# Altium footprint library DrPCB.PcbLib: 910 footprints (part 55 of 57)
Each footprint in its own frame and in the unit in brackets; x right, y up, seen from the top. Pads: shape width x height; smd on the part's side, far side on the other; paste and mask are expansions set on the pad; w line width, h text height; cw(c..) or ccw(c..) is an arc to the next point about the centre after c.
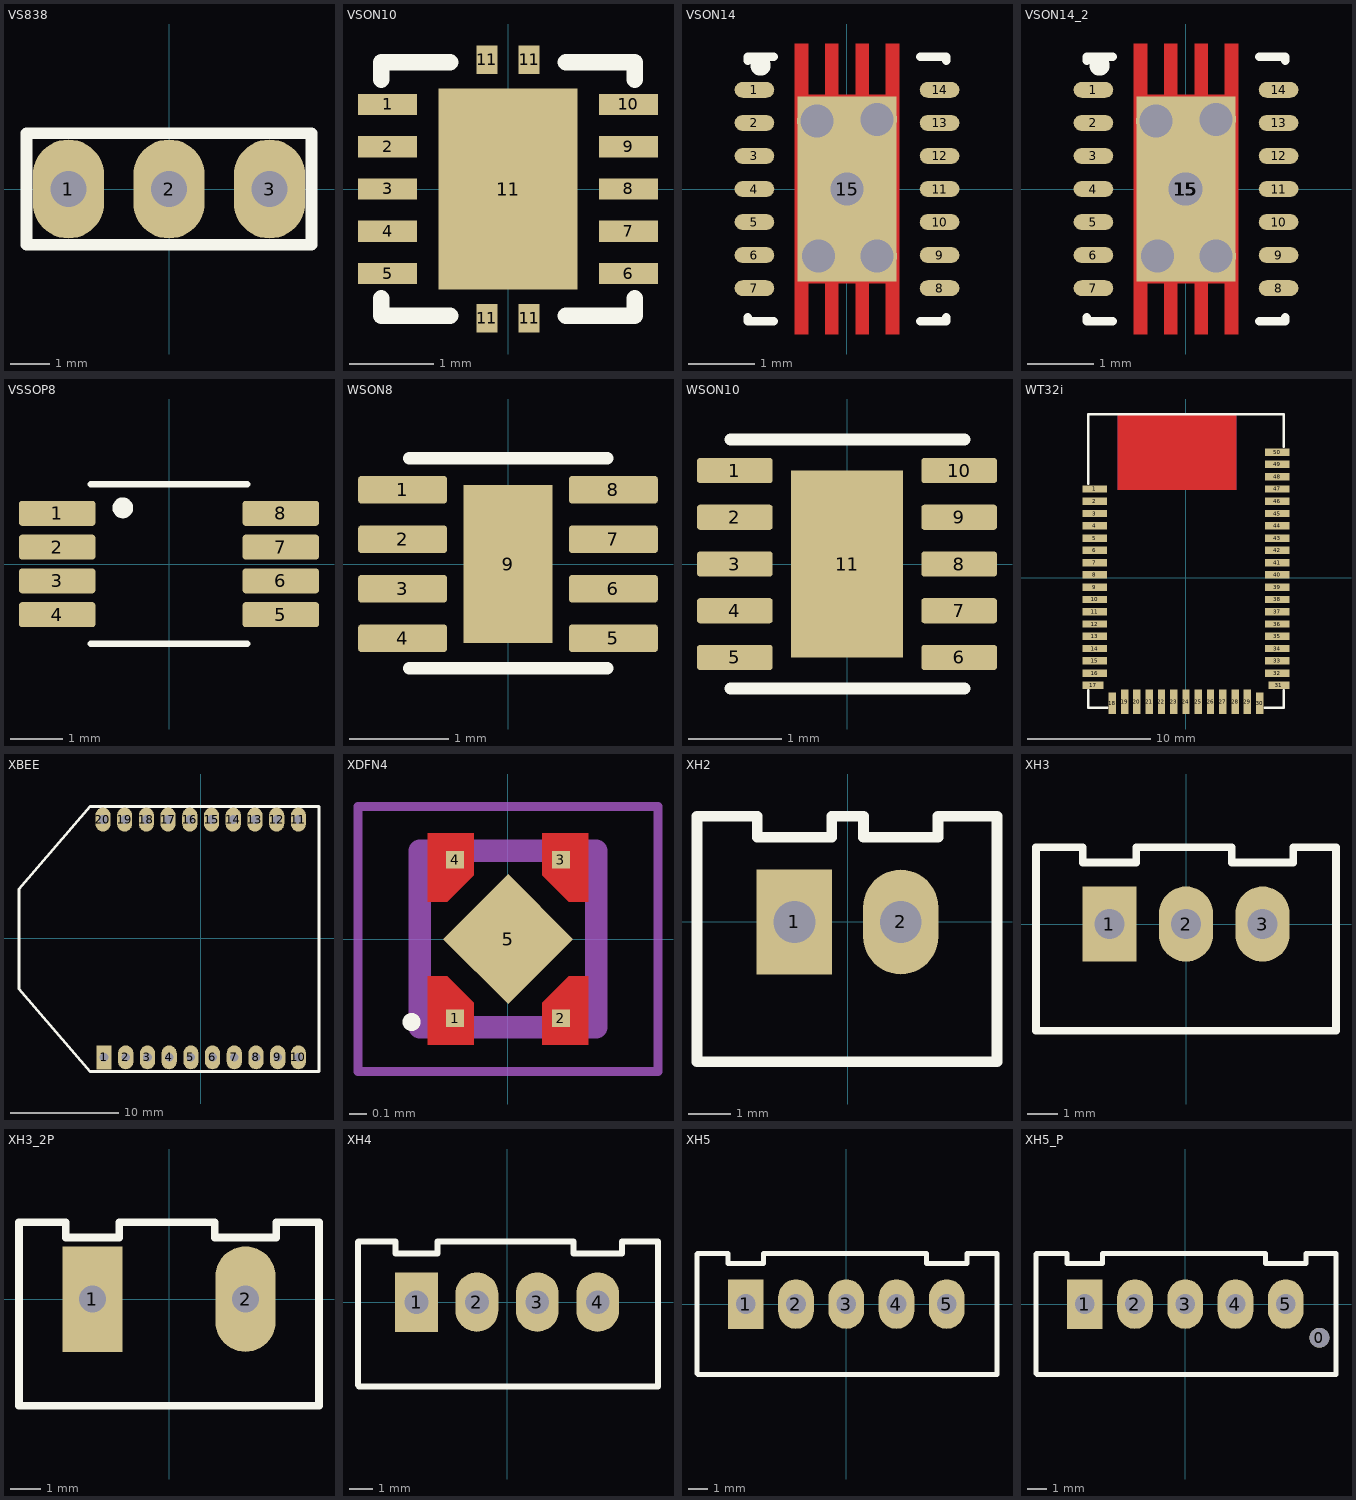
[diagram p54: the footprints below, top view; thin cyan lines are the x and y axes]

## VS838 [mm]
pads (3):
  oval 1.8x2.5 hole 0.9: 1(-2.54,0) 2(0,0) 3(2.54,0)
Top Overlay:
  lines w0.3: -3.6,-1.41 3.6,-1.41 3.6,1.41 -3.6,1.41 -3.6,-1.41
3D body "everlight-irm-3638f4.step": height 8.11, standoff -0.75, extent -3,-0.26 3,9.19

## VSON10 [mm]
pads (15):
  rect 0.7x0.25 smd: 1(-1.425,1) 2(-1.425,0.5) 3(-1.425,0) 4(-1.425,-0.5) 5(-1.425,-1) 6(1.425,-1) 7(1.425,-0.5) 8(1.425,0) 9(1.425,0.5) 10(1.425,1)
  rect 0.25x0.34 smd: 11(-0.25,-1.53) 11(-0.25,1.53) 11(0.25,-1.53) 11(0.25,1.53)
  rect 1.65x2.38 smd: 11(0,0)
Top Overlay:
  lines w0.2: -1.5,-1.295 -1.5,-1.5 -0.686,-1.5 ; -1.5,1.295 -1.5,1.5 -0.686,1.5 ; 0.686,-1.5 1.5,-1.5 1.5,-1.295 ; 0.686,1.5 1.5,1.5 1.5,1.295
3D body "User Library-PVSON-10-1.STEP": height 0.91, standoff 0.01, extent -1.501,-1.501 1.501,1.501

## VSON14 [mm]
pads (15):
  oval 0.6x0.24 smd mask+0: 1(-1.4,1.5) 2(-1.4,1) 3(-1.4,0.5) 4(-1.4,0) 5(-1.4,-0.5) 6(-1.4,-1) 7(-1.4,-1.5) 8(1.4,-1.5) 9(1.4,-1) 10(1.4,-0.5) 11(1.4,0) 12(1.4,0.5) 13(1.4,1) 14(1.4,1.5)
  rect 1.5x2.8 smd paste-2 mask+0: 15(0,0)
via 0,0 diameter 0.6 hole 0.5
via 0.457,1.054 diameter 0.6 hole 0.5
via -0.457,1.029 diameter 0.6 hole 0.5
via 0.457,-1.016 diameter 0.6 hole 0.5
via -0.432,-1.016 diameter 0.6 hole 0.5
Top Layer:
  region: 0.79,-2.2 0.59,-2.2 0.59,-1.425 0.33,-1.425 0.33,-2.2 0.13,-2.2 0.13,-1.425 -0.13,-1.425 -0.13,-2.2 -0.33,-2.2 -0.33,-1.425 -0.59,-1.425 -0.59,-2.2 -0.79,-2.2 -0.79,2.2 -0.59,2.2 -0.59,1.425 -0.33,1.425 -0.33,2.2 -0.13,2.2 -0.13,1.425 0.13,1.425 0.13,2.2 0.33,2.2 0.33,1.425 0.59,1.425 0.59,2.2 0.79,2.2
Top Overlay:
  circle w0.254: c-1.308,1.867 r0.025
  lines w0.127: -1.5,-1.94 -1.5,-2 -1.11,-2 ; -1.5,1.94 -1.5,2 -1.11,2 ; 1.11,-2 1.5,-2 1.5,-1.94 ; 1.11,2 1.5,2 1.5,1.94
Top Paste:
  region: -0.13,0.1 -0.79,0.1 -0.79,2.2 -0.59,2.2 -0.59,1.35 -0.33,1.35 -0.33,2.2 -0.13,2.2
  region: 0.79,0.1 0.13,0.1 0.13,2.2 0.33,2.2 0.33,1.35 0.59,1.35 0.59,2.2 0.79,2.2
  region: 0.79,-2.2 0.59,-2.2 0.59,-1.35 0.33,-1.35 0.33,-2.2 0.13,-2.2 0.13,-0.1 0.79,-0.1
  region: -0.13,-2.2 -0.33,-2.2 -0.33,-1.35 -0.59,-1.35 -0.59,-2.2 -0.79,-2.2 -0.79,-0.1 -0.13,-0.1
Top Solder:
  drawing of 15 lines, arcs and shapes, not listed
3D body "User Library-VSON14.step": height 1, standoff -0.01, extent -1.5,-2 1.5,2

## VSON14_2 [mm]
pads (30):
  oval 0.6x0.24 smd paste-1 mask+0: 1(-1.4,1.5) 2(-1.4,1) 3(-1.4,0.5) 4(-1.4,0) 5(-1.4,-0.5) 6(-1.4,-1) 7(-1.4,-1.5) 8(1.4,-1.5) 9(1.4,-1) 10(1.4,-0.5) 11(1.4,0) 12(1.4,0.5) 13(1.4,1) 14(1.4,1.5)
  round 0.6 hole 0.5: 15(-0.013,0) 15(-0.013,0) 15(-0.013,0) 15(-0.013,0) 15(-0.013,0) 15(-0.013,0) 15(-0.013,0) 15(-0.013,0) 15(-0.013,0) 15(-0.013,0) 15(-0.013,0) 15(-0.013,0) 15(-0.013,0) 15(-0.013,0) 15(-0.013,0)
  rect 1.5x2.8 smd paste-2 mask+0: 15(0,0)
via -0.432,-1.016 diameter 0.6 hole 0.5
via 0.457,-1.016 diameter 0.6 hole 0.5
via -0.457,1.029 diameter 0.6 hole 0.5
via 0.457,1.054 diameter 0.6 hole 0.5
via 0,0 diameter 0.6 hole 0.5
Top Layer:
  region: 0.79,-2.2 0.59,-2.2 0.59,-1.425 0.33,-1.425 0.33,-2.2 0.13,-2.2 0.13,-1.425 -0.13,-1.425 -0.13,-2.2 -0.33,-2.2 -0.33,-1.425 -0.59,-1.425 -0.59,-2.2 -0.79,-2.2 -0.79,2.2 -0.59,2.2 -0.59,1.425 -0.33,1.425 -0.33,2.2 -0.13,2.2 -0.13,1.425 0.13,1.425 0.13,2.2 0.33,2.2 0.33,1.425 0.59,1.425 0.59,2.2 0.79,2.2
Top Overlay:
  circle w0.254: c-1.308,1.867 r0.025
  lines w0.127: -1.5,-1.94 -1.5,-2 -1.11,-2 ; -1.5,1.94 -1.5,2 -1.11,2 ; 1.11,-2 1.5,-2 1.5,-1.94 ; 1.11,2 1.5,2 1.5,1.94
Top Paste:
  region: -0.587,1.753 -0.587,2.153 -0.787,2.153 -0.787,1.753
  region: -0.128,1.753 -0.128,2.153 -0.328,2.153 -0.328,1.753
  region: 0.331,1.753 0.331,2.153 0.131,2.153 0.131,1.753
  region: 0.79,1.753 0.79,2.153 0.59,2.153 0.59,1.753
  region: -0.59,-2.134 -0.59,-1.734 -0.79,-1.734 -0.79,-2.134
  region: -0.13,-2.134 -0.13,-1.734 -0.33,-1.734 -0.33,-2.134
  region: 0.33,-2.134 0.33,-1.734 0.13,-1.734 0.13,-2.134
  region: 0.79,-2.134 0.79,-1.734 0.59,-1.734 0.59,-2.134
  rectangle: -1.6,-1.6 -1.2,-1.4
  rectangle: -1.6,-1.1 -1.2,-0.9
  rectangle: -1.6,-0.6 -1.2,-0.4
  rectangle: -1.6,-0.1 -1.2,0.1
  rectangle: -1.6,0.4 -1.2,0.6
  rectangle: -1.6,0.9 -1.2,1.1
  rectangle: -1.6,1.4 -1.2,1.6
  rectangle: 1.2,1.4 1.6,1.6
  rectangle: 1.2,0.9 1.6,1.1
  rectangle: 1.2,0.4 1.6,0.6
  rectangle: 1.2,-0.1 1.6,0.1
  rectangle: 1.2,-0.6 1.6,-0.4
  rectangle: 1.2,-1.1 1.6,-0.9
  rectangle: 1.2,-1.6 1.6,-1.4
  region: -0.13,-1.35 -0.33,-1.35 -0.59,-1.35 -0.79,-1.35 -0.79,-0.305 -0.13,-0.305
  region: 0.79,-1.35 0.59,-1.35 0.33,-1.35 0.13,-1.35 0.13,-0.305 0.79,-0.305
  region: 0.79,0.305 0.13,0.305 0.13,1.35 0.33,1.35 0.59,1.35 0.79,1.35
  region: -0.13,0.318 -0.79,0.318 -0.79,1.35 -0.59,1.35 -0.33,1.35 -0.13,1.35
Top Solder:
  drawing of 15 lines, arcs and shapes, not listed
3D body "User Library-VSON14.step": height 1, standoff -0.01, extent -1.5,-2 1.5,2

## VSSOP8 [mm]
pads (8):
  rrect25% 1.47x0.48 smd paste-0.1: 1(-2.15,0.975) 2(-2.15,0.325) 3(-2.15,-0.325) 4(-2.15,-0.975) 5(2.15,-0.975) 6(2.15,-0.325) 7(2.15,0.325) 8(2.15,0.975)
Top Overlay:
  circle w0.2: c-0.889,1.079 r0.1
  lines w0.127: -1.5,-1.535 1.5,-1.535 ; -1.5,1.535 1.5,1.535
3D body "TPS62160DGKT.STEP": height 1.1, standoff 0, extent -2.45,-1.5 2.45,1.5

## WSON8 [mm]
pads (9):
  rrect25% 0.9x0.28 smd paste-0.07: 1(-1.065,0.75) 2(-1.065,0.25) 3(-1.065,-0.25) 4(-1.065,-0.75) 5(1.065,-0.75) 6(1.065,-0.25) 7(1.065,0.25) 8(1.065,0.75)
  rect 0.9x1.6 smd paste-2: 9(0,0)
Top Overlay:
  lines w0.127: -0.997,-1.054 1.003,-1.054 ; -0.997,1.067 1.003,1.067
Top Paste:
  region: 0.28,-0.51 -0.28,-0.51 -0.28,0.51 0.28,0.51
3D body "TPS62160DSGR.STEP": height 0.8, standoff 0, extent -1,-1 1,1

## WSON10 [mm]
pads (11):
  rrect25% 0.81x0.27 smd: 1(-1.2,1) 2(-1.2,0.5) 3(-1.2,0) 4(-1.2,-0.5) 5(-1.2,-1) 6(1.2,-1) 7(1.2,-0.5) 8(1.2,0) 9(1.2,0.5) 10(1.2,1)
  rect 1.2x2 smd paste-2: 11(0,0)
Top Overlay:
  lines w0.127: -1.245,-1.333 1.255,-1.333 ; -1.245,1.333 1.255,1.333
Top Paste:
  region: 0.379,-0.633 -0.379,-0.633 -0.379,0.633 0.379,0.633
3D body "step_temp.STEP": height 0.75, standoff -0.05, extent -1.25,-1.25 1.25,1.25

## WT32i [mm]
pads (50):
  rect 2x0.6 smd: 1(-7.45,7.227) 2(-7.45,6.227) 3(-7.45,5.227) 4(-7.45,4.227) 5(-7.45,3.227) 6(-7.45,2.227) 7(-7.45,1.227) 8(-7.45,0.228) 9(-7.45,-0.772) 10(-7.45,-1.772) 11(-7.45,-2.772) 12(-7.45,-3.772) 13(-7.45,-4.772) 14(-7.45,-5.772) 15(-7.45,-6.772) 16(-7.45,-7.772) 32(7.45,-7.772) 33(7.45,-6.772) 34(7.45,-5.772) 35(7.45,-4.772) 36(7.45,-3.772) 37(7.45,-2.772) 38(7.45,-1.772) 39(7.45,-0.772) 40(7.45,0.228) 41(7.45,1.227) 42(7.45,2.227) 43(7.45,3.227) 44(7.45,4.227) 45(7.45,5.227) 46(7.45,6.227) 47(7.45,7.227) 48(7.45,8.227) 49(7.45,9.227) 50(7.45,10.227)
  rect 1.75x0.6 smd: 17(-7.575,-8.772) 31(7.575,-8.772)
  rect 0.6x1.75 smd: 18(-6,-10.227) 30(6,-10.227)
  rect 0.6x2 smd: 19(-5,-10.102) 20(-4,-10.102) 21(-3,-10.102) 22(-2,-10.102) 23(-1,-10.102) 24(0,-10.102) 25(1,-10.102) 26(2,-10.102) 27(3,-10.102) 28(4,-10.102) 29(5,-10.102)
Top Layer:
  pour cut-out: 5.41,8.625
  pour cut-out: 4.089,13.281 4.089,7.165 -5.563,7.165 -5.563,13.334
Bottom Layer:
  pour cut-out: 4.089,13.281 4.089,7.165 -5.575,7.165 -5.575,13.334
Top Overlay:
  lines w0.2: -7.95,-9.18 -7.95,-10.602 -6.413,-10.602 ; -7.95,7.647 -7.95,13.298 7.95,13.298 7.95,10.657 ; 6.414,-10.602 7.95,-10.602 7.95,-9.18
3D body "User Library-Bluetooth Module WT32i.STEP": height 2.4, standoff 0, extent -7.95,-10.578 7.95,13.322

## XBEE [mm]
pads (20):
  rect 1.4x2.2 hole 0.8: 1(-8.9,-10.95)
  oval 1.4x2.2 hole 0.8: 2(-6.9,-10.95) 3(-4.9,-10.95) 4(-2.9,-10.95) 5(-0.9,-10.95) 6(1.1,-10.95) 7(3.1,-10.95) 8(5.1,-10.95) 9(7.1,-10.95) 10(9,-10.95) 11(9,10.95) 12(7,10.95) 13(5,10.95) 14(3,10.95) 15(1,10.95) 16(-1,10.95) 17(-3,10.95) 18(-5,10.95) 19(-7,10.95) 20(-9,10.95)
Top Overlay:
  lines w0.254: -16.73,-4.65 -10.2,-12.25 10.9,-12.25 10.9,12.15 -10.2,12.15 -16.73,4.55 -16.73,-4.65

## XDFN4 [mm]
pads (5):
  rect 0.1x0.1 smd: 1(-0.3,-0.45) 2(0.3,-0.45) 3(0.3,0.45) 4(-0.3,0.45)
  rect 0.52x0.52 smd rot 45 mask+0: 5(0,0)
Top Layer:
  region: 0.455,-0.21 0.345,-0.21 0.195,-0.36 0.195,-0.6 0.455,-0.6 0.455,-0.21 0.345,-0.21
  region: -0.455,-0.21 -0.345,-0.21 -0.195,-0.36 -0.195,-0.6 -0.455,-0.6 -0.455,-0.21 -0.345,-0.21
  region: -0.455,0.21 -0.345,0.21 -0.195,0.36 -0.195,0.6 -0.455,0.6 -0.455,0.21 -0.345,0.21
  region: 0.455,0.21 0.345,0.21 0.195,0.36 0.195,0.6 0.455,0.6 0.455,0.21 0.345,0.21
Top Overlay:
  circle w0.1: c-0.546,-0.47 r0.001
Top Paste:
  region: 0.455,-0.21 0.345,-0.21 0.195,-0.36 0.195,-0.6 0.455,-0.6 0.455,-0.21 0.345,-0.21
  region: -0.455,-0.21 -0.345,-0.21 -0.195,-0.36 -0.195,-0.6 -0.455,-0.6 -0.455,-0.21 -0.345,-0.21
  region: -0.455,0.21 -0.345,0.21 -0.195,0.36 -0.195,0.6 -0.455,0.6 -0.455,0.21 -0.345,0.21
  region: 0.455,0.21 0.345,0.21 0.195,0.36 0.195,0.6 0.455,0.6 0.455,0.21 0.345,0.21
Mechanical 4:
  lines w0.127: -0.5,-0.5 0.5,-0.5 ; -0.5,-0.5 -0.5,0.5 ; -0.5,-0.5 0.5,-0.5 ; -0.5,-0.5 -0.5,0.5 ; -0.5,0.5 0.5,0.5 ; -0.5,0.5 0.5,0.5 ; 0.5,-0.5 0.5,0.5 ; 0.5,-0.5 0.5,0.5
Mechanical 16:
  lines w0.05: -0.85,-0.75 0.85,-0.75 0.85,0.75 -0.85,0.75 -0.85,-0.75

## XH2 [mm]
pads (2):
  rect 1.8x2.5 hole 1: 1(-1.27,0)
  oval 1.8x2.5 hole 1: 2(1.27,0)
Top Overlay:
  lines w0.254: -3.594,2.515 -3.594,-3.34 3.569,-3.34 3.569,2.502 ; -3.594,2.527 -2.159,2.527 -2.159,2.019 -0.381,2.019 -0.381,2.527 0.381,2.527 0.381,2.019 2.159,2.019 2.159,2.527 3.569,2.527
3D body "JST - XH - Thru - 2Pin - 2.5mm (Genuine).stp": height 7.21, standoff -3, extent -3.587,-3.353 3.587,2.489

## XH3 [mm]
pads (3):
  rect 1.8x2.5 hole 1: 1(-2.54,0)
  oval 1.8x2.5 hole 1: 2(0,0) 3(2.54,0)
Top Overlay:
  lines w0.254: -1.651,2.553 -1.651,2.045 -3.429,2.045 -3.429,2.553 -4.978,2.553 -4.978,-3.543 4.978,-3.543 4.978,2.553 3.556,2.553 3.556,2.045 1.524,2.045 1.524,2.553 -1.626,2.553
3D body "JST - XH - Thru - 3Pin - 2.5mm (Genuine).stp": height 7.21, standoff -3, extent -4.837,-3.404 4.837,2.438

## XH3_2P [mm]
pads (2):
  rect 2x3.5 hole 0.9: 1(-2.54,0)
  oval 2x3.5 hole 0.9: 2(2.54,0)
Top Overlay:
  lines w0.254: -1.651,2.553 -1.651,2.045 -3.429,2.045 -3.429,2.553 -4.978,2.553 -4.978,-3.543 4.978,-3.543 4.978,2.553 3.556,2.553 3.556,2.045 1.524,2.045 1.524,2.553 -1.626,2.553
3D body "JST - XH - Thru - 3Pin - 2.5mm (Genuine).stp": height 7.21, standoff -3, extent -4.837,-3.404 4.837,2.438

## XH4 [mm]
pads (4):
  rect 1.8x2.5 hole 1: 1(-3.81,0)
  oval 1.8x2.5 hole 1: 2(-1.27,0) 3(1.27,0) 4(3.81,0)
Top Overlay:
  lines w0.254: -6.274,-3.495 -6.274,2.527 -6.248,2.553 -4.699,2.553 -4.699,2.045 -2.921,2.045 -2.921,2.553 2.794,2.553 2.794,2.045 4.826,2.045 4.826,2.553 6.35,2.553 ; -6.223,-3.551 6.35,-3.551 6.35,2.527
3D body "xh4.step": height 7, standoff -3.4, extent -6.2,-3.366 6.2,2.385

## XH5 [mm]
pads (5):
  rect 1.8x2.5 hole 1: 1(-5.08,0)
  oval 1.8x2.5 hole 1: 2(-2.54,0) 3(0,0) 4(2.54,0) 5(5.08,0)
Top Overlay:
  lines w0.254: -7.544,-3.495 -7.544,2.527 -7.518,2.553 -5.969,2.553 -5.969,2.045 -4.191,2.045 -4.191,2.553 4.039,2.553 ; -7.493,-3.551 7.595,-3.551 ; 4.064,2.553 4.064,2.045 6.096,2.045 6.096,2.553 7.62,2.553 ; 7.62,-3.551 7.62,2.527
3D body "User Library-JST B5B-XH-A.step": height 7, standoff -3.4, extent -7.45,-3.387 7.45,2.363

## XH5_P [mm]
pads (6):
  round 1 hole 1: 0(6.78,-1.7)
  rect 1.8x2.5 hole 1: 1(-5.08,0)
  oval 1.8x2.5 hole 1: 2(-2.54,0) 3(0,0) 4(2.54,0) 5(5.08,0)
Top Overlay:
  lines w0.254: -7.544,-3.495 -7.544,2.527 -7.518,2.553 -5.969,2.553 -5.969,2.045 -4.191,2.045 -4.191,2.553 4.039,2.553 ; -7.493,-3.551 7.595,-3.551 ; 4.064,2.553 4.064,2.045 6.096,2.045 6.096,2.553 7.62,2.553 ; 7.62,-3.551 7.62,2.527
3D body "User Library-JST B5B-XH-A.step": height 7, standoff -3.4, extent -7.45,-3.387 7.45,2.363